# Altium schematic symbol library jlcpcb_2025_04_inductors_extended_0402.schlib: 1396 symbols (part 7 of 8) (continued)
## VHF100505H10NJT
designator L?  Inductance: 10nH
Inductor, 10nH, ±5%, 470mΩ, 250mA, SMD 0402; Manufacturer: FH(Guangdong Fenghua Advanced Tech); Manufacturer Part Number: VHF100505H10NJT; Package Size: 0402; JLCPCB Basic Part: No; JLCPCB Part Number: C90140; Supplier 1: LCSC; Category: Inductors; Supplier Part Number 1: C90140; Tolerance: ±5%; Rated Current: 250mA; DC Resistance: 470mΩ; RoHS: Yes; ComponentLink1Description: Datasheet; ComponentLink1URL: https://wmsc.lcsc.com/wmsc/upload/file/pdf/v2/lcsc/2304140030_FH--Guangdong-Fenghua-Advanced-Tech-VHF100505H10NJT_C90140.pdf; ComponentLink2Description: JLCPCB Part URL; ComponentLink2URL: https://jlcpcb.com/partdetail/C90140; ComponentLink3Description: LCSC Part URL; ComponentLink3URL: https://lcsc.com/product-detail/Inductors-SMD_FH-Guangdong-Fenghua-Advanced-Tech-FH-Guangdong-Fenghua-Advanced-Tech-VHF100505H10NJT_C90140.html
footprint IND-0402 (0402 (1005M) Inductor)
pins: 1, 2

## VHF100505H10NKT
designator L?  Inductance: 10nH
Inductor, 10nH, ±10%, 200mΩ, 300mA, SMD 0402; Manufacturer: FH(Guangdong Fenghua Advanced Tech); Manufacturer Part Number: VHF100505H10NKT; Package Size: 0402; JLCPCB Basic Part: No; JLCPCB Part Number: C381878; Supplier 1: LCSC; Category: Inductors; Supplier Part Number 1: C381878; Tolerance: ±10%; Rated Current: 300mA; DC Resistance: 200mΩ; RoHS: Yes; ComponentLink1Description: Datasheet; ComponentLink1URL: https://wmsc.lcsc.com/wmsc/upload/file/pdf/v2/lcsc/2304140030_FH--Guangdong-Fenghua-Advanced-Tech-VHF100505H10NKT_C381878.pdf; ComponentLink2Description: JLCPCB Part URL; ComponentLink2URL: https://jlcpcb.com/partdetail/C381878; ComponentLink3Description: LCSC Part URL; ComponentLink3URL: https://lcsc.com/product-detail/Inductors-SMD_FH-Guangdong-Fenghua-Advanced-Tech-FH-Guangdong-Fenghua-Advanced-Tech-VHF100505H10NKT_C381878.html
footprint IND-0402 (0402 (1005M) Inductor)
pins: 1, 2

## VHF100505H12NJT
designator L?  Inductance: 12nH
Inductor, 12nH, ±5%, 550mΩ, 250mA, SMD 0402; Manufacturer: FH(Guangdong Fenghua Advanced Tech); Manufacturer Part Number: VHF100505H12NJT; Package Size: 0402; JLCPCB Basic Part: No; JLCPCB Part Number: C90199; Supplier 1: LCSC; Category: Inductors; Supplier Part Number 1: C90199; Tolerance: ±5%; Rated Current: 250mA; DC Resistance: 550mΩ; RoHS: Yes; ComponentLink1Description: Datasheet; ComponentLink1URL: https://wmsc.lcsc.com/wmsc/upload/file/pdf/v2/lcsc/2304140030_FH--Guangdong-Fenghua-Advanced-Tech-VHF100505H12NJT_C90199.pdf; ComponentLink2Description: JLCPCB Part URL; ComponentLink2URL: https://jlcpcb.com/partdetail/C90199; ComponentLink3Description: LCSC Part URL; ComponentLink3URL: https://lcsc.com/product-detail/Inductors-SMD_FH-Guangdong-Fenghua-Advanced-Tech-FH-Guangdong-Fenghua-Advanced-Tech-VHF100505H12NJT_C90199.html
footprint IND-0402 (0402 (1005M) Inductor)
pins: 1, 2

## VHF100505H15NJT
designator L?  Inductance: 15nH
Inductor, 15nH, ±5%, 700mΩ, 250mA, SMD 0402; Manufacturer: FH(Guangdong Fenghua Advanced Tech); Manufacturer Part Number: VHF100505H15NJT; Package Size: 0402; JLCPCB Basic Part: No; JLCPCB Part Number: C90174; Supplier 1: LCSC; Category: Inductors; Supplier Part Number 1: C90174; Tolerance: ±5%; Rated Current: 250mA; DC Resistance: 700mΩ; RoHS: Yes; ComponentLink1Description: Datasheet; ComponentLink1URL: https://wmsc.lcsc.com/wmsc/upload/file/pdf/v2/lcsc/2304140030_FH--Guangdong-Fenghua-Advanced-Tech-VHF100505H15NJT_C90174.pdf; ComponentLink2Description: JLCPCB Part URL; ComponentLink2URL: https://jlcpcb.com/partdetail/C90174; ComponentLink3Description: LCSC Part URL; ComponentLink3URL: https://lcsc.com/product-detail/Inductors-SMD_FH-Guangdong-Fenghua-Advanced-Tech-FH-Guangdong-Fenghua-Advanced-Tech-VHF100505H15NJT_C90174.html
footprint IND-0402 (0402 (1005M) Inductor)
pins: 1, 2

## VHF100505H15NKT
designator L?  Inductance: 15nH
Inductor, 15nH, ±10%, 200mΩ, 300mA, SMD 0402; Manufacturer: FH(Guangdong Fenghua Advanced Tech); Manufacturer Part Number: VHF100505H15NKT; Package Size: 0402; JLCPCB Basic Part: No; JLCPCB Part Number: C381880; Supplier 1: LCSC; Category: Inductors; Supplier Part Number 1: C381880; Tolerance: ±10%; Rated Current: 300mA; DC Resistance: 200mΩ; RoHS: Yes; ComponentLink1Description: Datasheet; ComponentLink1URL: https://wmsc.lcsc.com/wmsc/upload/file/pdf/v2/lcsc/2304140030_FH--Guangdong-Fenghua-Advanced-Tech-VHF100505H15NKT_C381880.pdf; ComponentLink2Description: JLCPCB Part URL; ComponentLink2URL: https://jlcpcb.com/partdetail/C381880; ComponentLink3Description: LCSC Part URL; ComponentLink3URL: https://lcsc.com/product-detail/Inductors-SMD_FH-Guangdong-Fenghua-Advanced-Tech-FH-Guangdong-Fenghua-Advanced-Tech-VHF100505H15NKT_C381880.html
footprint IND-0402 (0402 (1005M) Inductor)
pins: 1, 2

## VHF100505H18NJT
designator L?  Inductance: 18nH
Inductor, 18nH, ±5%, 700mΩ, 200mA, SMD 0402; Manufacturer: FH(Guangdong Fenghua Advanced Tech); Manufacturer Part Number: VHF100505H18NJT; Package Size: 0402; JLCPCB Basic Part: No; JLCPCB Part Number: C90175; Supplier 1: LCSC; Category: Inductors; Supplier Part Number 1: C90175; Tolerance: ±5%; Rated Current: 200mA; DC Resistance: 700mΩ; RoHS: Yes; ComponentLink1Description: Datasheet; ComponentLink1URL: https://wmsc.lcsc.com/wmsc/upload/file/pdf/v2/lcsc/2304140030_FH--Guangdong-Fenghua-Advanced-Tech-VHF100505H18NJT_C90175.pdf; ComponentLink2Description: JLCPCB Part URL; ComponentLink2URL: https://jlcpcb.com/partdetail/C90175; ComponentLink3Description: LCSC Part URL; ComponentLink3URL: https://lcsc.com/product-detail/Inductors-SMD_FH-Guangdong-Fenghua-Advanced-Tech-FH-Guangdong-Fenghua-Advanced-Tech-VHF100505H18NJT_C90175.html
footprint IND-0402 (0402 (1005M) Inductor)
pins: 1, 2

## VHF100505H18NKT
designator L?  Inductance: 18nH
Inductor, 18nH, ±10%, 200mΩ, 300mA, SMD 0402; Manufacturer: FH(Guangdong Fenghua Advanced Tech); Manufacturer Part Number: VHF100505H18NKT; Package Size: 0402; JLCPCB Basic Part: No; JLCPCB Part Number: C381881; Supplier 1: LCSC; Category: Inductors; Supplier Part Number 1: C381881; Tolerance: ±10%; Rated Current: 300mA; DC Resistance: 200mΩ; RoHS: Yes; ComponentLink1Description: Datasheet; ComponentLink1URL: https://wmsc.lcsc.com/wmsc/upload/file/pdf/v2/lcsc/2304140030_FH--Guangdong-Fenghua-Advanced-Tech-VHF100505H18NKT_C381881.pdf; ComponentLink2Description: JLCPCB Part URL; ComponentLink2URL: https://jlcpcb.com/partdetail/C381881; ComponentLink3Description: LCSC Part URL; ComponentLink3URL: https://lcsc.com/product-detail/Inductors-SMD_FH-Guangdong-Fenghua-Advanced-Tech-FH-Guangdong-Fenghua-Advanced-Tech-VHF100505H18NKT_C381881.html
footprint IND-0402 (0402 (1005M) Inductor)
pins: 1, 2

## VHF100505H20NJT
designator L?  Inductance: 20nH
Inductor, 20nH, ±5%, 1.1Ω, 200mA, SMD 0402; Manufacturer: FH(Guangdong Fenghua Advanced Tech); Manufacturer Part Number: VHF100505H20NJT; Package Size: 0402; JLCPCB Basic Part: No; JLCPCB Part Number: C381846; Supplier 1: LCSC; Category: Inductors; Supplier Part Number 1: C381846; Tolerance: ±5%; Rated Current: 200mA; DC Resistance: 1.1Ω; RoHS: Yes; ComponentLink1Description: Datasheet; ComponentLink1URL: https://wmsc.lcsc.com/wmsc/upload/file/pdf/v2/lcsc/2304140030_FH--Guangdong-Fenghua-Advanced-Tech-VHF100505H20NJT_C381846.pdf; ComponentLink2Description: JLCPCB Part URL; ComponentLink2URL: https://jlcpcb.com/partdetail/C381846; ComponentLink3Description: LCSC Part URL; ComponentLink3URL: https://lcsc.com/product-detail/Inductors-SMD_FH-Guangdong-Fenghua-Advanced-Tech-FH-Guangdong-Fenghua-Advanced-Tech-VHF100505H20NJT_C381846.html
footprint IND-0402 (0402 (1005M) Inductor)
pins: 1, 2

## VHF100505H20NKT
designator L?  Inductance: 20nH
Inductor, 20nH, ±10%, 1.1Ω, 200mA, SMD 0402; Manufacturer: FH(Guangdong Fenghua Advanced Tech); Manufacturer Part Number: VHF100505H20NKT; Package Size: 0402; JLCPCB Basic Part: No; JLCPCB Part Number: C381882; Supplier 1: LCSC; Category: Inductors; Supplier Part Number 1: C381882; Tolerance: ±10%; Rated Current: 200mA; DC Resistance: 1.1Ω; RoHS: Yes; ComponentLink1Description: Datasheet; ComponentLink1URL: https://wmsc.lcsc.com/wmsc/upload/file/pdf/v2/lcsc/2304140030_FH--Guangdong-Fenghua-Advanced-Tech-VHF100505H20NKT_C381882.pdf; ComponentLink2Description: JLCPCB Part URL; ComponentLink2URL: https://jlcpcb.com/partdetail/C381882; ComponentLink3Description: LCSC Part URL; ComponentLink3URL: https://lcsc.com/product-detail/Inductors-SMD_FH-Guangdong-Fenghua-Advanced-Tech-FH-Guangdong-Fenghua-Advanced-Tech-VHF100505H20NKT_C381882.html
footprint IND-0402 (0402 (1005M) Inductor)
pins: 1, 2

## VHF100505H22NJT
designator L?  Inductance: 22nH
Inductor, 22nH, ±5%, 900mΩ, 200mA, SMD 0402; Manufacturer: FH(Guangdong Fenghua Advanced Tech); Manufacturer Part Number: VHF100505H22NJT; Package Size: 0402; JLCPCB Basic Part: No; JLCPCB Part Number: C90176; Supplier 1: LCSC; Category: Inductors; Supplier Part Number 1: C90176; Tolerance: ±5%; Rated Current: 200mA; DC Resistance: 900mΩ; RoHS: Yes; ComponentLink1Description: Datasheet; ComponentLink1URL: https://wmsc.lcsc.com/wmsc/upload/file/pdf/v2/lcsc/2304140030_FH--Guangdong-Fenghua-Advanced-Tech-VHF100505H22NJT_C90176.pdf; ComponentLink2Description: JLCPCB Part URL; ComponentLink2URL: https://jlcpcb.com/partdetail/C90176; ComponentLink3Description: LCSC Part URL; ComponentLink3URL: https://lcsc.com/product-detail/Inductors-SMD_FH-Guangdong-Fenghua-Advanced-Tech-FH-Guangdong-Fenghua-Advanced-Tech-VHF100505H22NJT_C90176.html
footprint IND-0402 (0402 (1005M) Inductor)
pins: 1, 2

## VHF100505H22NKT
designator L?  Inductance: 22nH
Inductor, 22nH, ±10%, 200mΩ, 300mA, SMD 0402; Manufacturer: FH(Guangdong Fenghua Advanced Tech); Manufacturer Part Number: VHF100505H22NKT; Package Size: 0402; JLCPCB Basic Part: No; JLCPCB Part Number: C381883; Supplier 1: LCSC; Category: Inductors; Supplier Part Number 1: C381883; Tolerance: ±10%; Rated Current: 300mA; DC Resistance: 200mΩ; RoHS: Yes; ComponentLink1Description: Datasheet; ComponentLink1URL: https://wmsc.lcsc.com/wmsc/upload/file/pdf/v2/lcsc/2304140030_FH--Guangdong-Fenghua-Advanced-Tech-VHF100505H22NKT_C381883.pdf; ComponentLink2Description: JLCPCB Part URL; ComponentLink2URL: https://jlcpcb.com/partdetail/C381883; ComponentLink3Description: LCSC Part URL; ComponentLink3URL: https://lcsc.com/product-detail/Inductors-SMD_FH-Guangdong-Fenghua-Advanced-Tech-FH-Guangdong-Fenghua-Advanced-Tech-VHF100505H22NKT_C381883.html
footprint IND-0402 (0402 (1005M) Inductor)
pins: 1, 2

## VHF100505H24NJT
designator L?  Inductance: 24nH
Inductor, 24nH, ±5%, SMD 0402; Manufacturer: FH(Guangdong Fenghua Advanced Tech); Manufacturer Part Number: VHF100505H24NJT; Package Size: 0402; JLCPCB Basic Part: No; JLCPCB Part Number: C401493; Supplier 1: LCSC; Category: Inductors; Supplier Part Number 1: C401493; Tolerance: ±5%; RoHS: Yes; ComponentLink1Description: Datasheet; ComponentLink1URL: https://wmsc.lcsc.com/wmsc/upload/file/pdf/v2/lcsc/2304140030_FH--Guangdong-Fenghua-Advanced-Tech-VHF100505H24NJT_C401493.pdf; ComponentLink2Description: JLCPCB Part URL; ComponentLink2URL: https://jlcpcb.com/partdetail/C401493; ComponentLink3Description: LCSC Part URL; ComponentLink3URL: https://lcsc.com/product-detail/Inductors-SMD_FH-Guangdong-Fenghua-Advanced-Tech-FH-Guangdong-Fenghua-Advanced-Tech-VHF100505H24NJT_C401493.html
footprint IND-0402 (0402 (1005M) Inductor)
pins: 1, 2

## VHF100505H27NJT
designator L?  Inductance: 27nH
Inductor, 27nH, ±5%, 100mΩ, 200mA, SMD 0402; Manufacturer: FH(Guangdong Fenghua Advanced Tech); Manufacturer Part Number: VHF100505H27NJT; Package Size: 0402; JLCPCB Basic Part: No; JLCPCB Part Number: C90177; Supplier 1: LCSC; Category: Inductors; Supplier Part Number 1: C90177; Tolerance: ±5%; Rated Current: 200mA; DC Resistance: 100mΩ; RoHS: Yes; ComponentLink1Description: Datasheet; ComponentLink1URL: https://wmsc.lcsc.com/wmsc/upload/file/pdf/v2/lcsc/2304140030_FH--Guangdong-Fenghua-Advanced-Tech-VHF100505H27NJT_C90177.pdf; ComponentLink2Description: JLCPCB Part URL; ComponentLink2URL: https://jlcpcb.com/partdetail/C90177; ComponentLink3Description: LCSC Part URL; ComponentLink3URL: https://lcsc.com/product-detail/Inductors-SMD_FH-Guangdong-Fenghua-Advanced-Tech-FH-Guangdong-Fenghua-Advanced-Tech-VHF100505H27NJT_C90177.html
footprint IND-0402 (0402 (1005M) Inductor)
pins: 1, 2

## VHF100505H27NKT
designator L?  Inductance: 27nH
Inductor, 27nH, ±10%, 300mΩ, 300mA, SMD 0402; Manufacturer: FH(Guangdong Fenghua Advanced Tech); Manufacturer Part Number: VHF100505H27NKT; Package Size: 0402; JLCPCB Basic Part: No; JLCPCB Part Number: C381884; Supplier 1: LCSC; Category: Inductors; Supplier Part Number 1: C381884; Tolerance: ±10%; Rated Current: 300mA; DC Resistance: 300mΩ; RoHS: Yes; ComponentLink1Description: Datasheet; ComponentLink1URL: https://wmsc.lcsc.com/wmsc/upload/file/pdf/v2/lcsc/2304140030_FH--Guangdong-Fenghua-Advanced-Tech-VHF100505H27NKT_C381884.pdf; ComponentLink2Description: JLCPCB Part URL; ComponentLink2URL: https://jlcpcb.com/partdetail/C381884; ComponentLink3Description: LCSC Part URL; ComponentLink3URL: https://lcsc.com/product-detail/Inductors-SMD_FH-Guangdong-Fenghua-Advanced-Tech-FH-Guangdong-Fenghua-Advanced-Tech-VHF100505H27NKT_C381884.html
footprint IND-0402 (0402 (1005M) Inductor)
pins: 1, 2

## VHF100505H33NJT
designator L?  Inductance: 33nH
Inductor, 33nH, ±5%, 1.1Ω, 200mA, SMD 0402; Manufacturer: FH(Guangdong Fenghua Advanced Tech); Manufacturer Part Number: VHF100505H33NJT; Package Size: 0402; JLCPCB Basic Part: No; JLCPCB Part Number: C401492; Supplier 1: LCSC; Category: Inductors; Supplier Part Number 1: C401492; Tolerance: ±5%; Rated Current: 200mA; DC Resistance: 1.1Ω; RoHS: Yes; ComponentLink1Description: Datasheet; ComponentLink1URL: https://wmsc.lcsc.com/wmsc/upload/file/pdf/v2/lcsc/2304140030_FH--Guangdong-Fenghua-Advanced-Tech-VHF100505H33NJT_C401492.pdf; ComponentLink2Description: JLCPCB Part URL; ComponentLink2URL: https://jlcpcb.com/partdetail/C401492; ComponentLink3Description: LCSC Part URL; ComponentLink3URL: https://lcsc.com/product-detail/Inductors-SMD_FH-Guangdong-Fenghua-Advanced-Tech-FH-Guangdong-Fenghua-Advanced-Tech-VHF100505H33NJT_C401492.html
footprint IND-0402 (0402 (1005M) Inductor)
pins: 1, 2

## VHF100505H33NKT
designator L?  Inductance: 33nH
Inductor, 33nH, ±10%, 300mΩ, 300mA, SMD 0402; Manufacturer: FH(Guangdong Fenghua Advanced Tech); Manufacturer Part Number: VHF100505H33NKT; Package Size: 0402; JLCPCB Basic Part: No; JLCPCB Part Number: C381885; Supplier 1: LCSC; Category: Inductors; Supplier Part Number 1: C381885; Tolerance: ±10%; Rated Current: 300mA; DC Resistance: 300mΩ; RoHS: Yes; ComponentLink1Description: Datasheet; ComponentLink1URL: https://wmsc.lcsc.com/wmsc/upload/file/pdf/v2/lcsc/2304140030_FH--Guangdong-Fenghua-Advanced-Tech-VHF100505H33NKT_C381885.pdf; ComponentLink2Description: JLCPCB Part URL; ComponentLink2URL: https://jlcpcb.com/partdetail/C381885; ComponentLink3Description: LCSC Part URL; ComponentLink3URL: https://lcsc.com/product-detail/Inductors-SMD_FH-Guangdong-Fenghua-Advanced-Tech-FH-Guangdong-Fenghua-Advanced-Tech-VHF100505H33NKT_C381885.html
footprint IND-0402 (0402 (1005M) Inductor)
pins: 1, 2

## VHF100505H39NJT
designator L?  Inductance: 39nH
Inductor, 39nH, ±5%, 1.3Ω, 150mA, SMD 0402; Manufacturer: FH(Guangdong Fenghua Advanced Tech); Manufacturer Part Number: VHF100505H39NJT; Package Size: 0402; JLCPCB Basic Part: No; JLCPCB Part Number: C90179; Supplier 1: LCSC; Category: Inductors; Supplier Part Number 1: C90179; Tolerance: ±5%; Rated Current: 150mA; DC Resistance: 1.3Ω; RoHS: Yes; ComponentLink1Description: Datasheet; ComponentLink1URL: https://wmsc.lcsc.com/wmsc/upload/file/pdf/v2/lcsc/2304140030_FH--Guangdong-Fenghua-Advanced-Tech-VHF100505H39NJT_C90179.pdf; ComponentLink2Description: JLCPCB Part URL; ComponentLink2URL: https://jlcpcb.com/partdetail/C90179; ComponentLink3Description: LCSC Part URL; ComponentLink3URL: https://lcsc.com/product-detail/Inductors-SMD_FH-Guangdong-Fenghua-Advanced-Tech-FH-Guangdong-Fenghua-Advanced-Tech-VHF100505H39NJT_C90179.html
footprint IND-0402 (0402 (1005M) Inductor)
pins: 1, 2

## VHF100505H39NKT
designator L?  Inductance: 39nH
Inductor, 39nH, ±10%, 300mΩ, 300mA, SMD 0402; Manufacturer: FH(Guangdong Fenghua Advanced Tech); Manufacturer Part Number: VHF100505H39NKT; Package Size: 0402; JLCPCB Basic Part: No; JLCPCB Part Number: C381886; Supplier 1: LCSC; Category: Inductors; Supplier Part Number 1: C381886; Tolerance: ±10%; Rated Current: 300mA; DC Resistance: 300mΩ; RoHS: Yes; ComponentLink1Description: Datasheet; ComponentLink1URL: https://wmsc.lcsc.com/wmsc/upload/file/pdf/v2/lcsc/2304140030_FH--Guangdong-Fenghua-Advanced-Tech-VHF100505H39NKT_C381886.pdf; ComponentLink2Description: JLCPCB Part URL; ComponentLink2URL: https://jlcpcb.com/partdetail/C381886; ComponentLink3Description: LCSC Part URL; ComponentLink3URL: https://lcsc.com/product-detail/Inductors-SMD_FH-Guangdong-Fenghua-Advanced-Tech-FH-Guangdong-Fenghua-Advanced-Tech-VHF100505H39NKT_C381886.html
footprint IND-0402 (0402 (1005M) Inductor)
pins: 1, 2

## VHF100505H43NJT
designator L?  Inductance: 43nH
Inductor, 43nH, ±5%, 1.1Ω, 200mA, SMD 0402; Manufacturer: FH(Guangdong Fenghua Advanced Tech); Manufacturer Part Number: VHF100505H43NJT; Package Size: 0402; JLCPCB Basic Part: No; JLCPCB Part Number: C381847; Supplier 1: LCSC; Category: Inductors; Supplier Part Number 1: C381847; Tolerance: ±5%; Rated Current: 200mA; DC Resistance: 1.1Ω; RoHS: Yes; ComponentLink1Description: Datasheet; ComponentLink1URL: https://wmsc.lcsc.com/wmsc/upload/file/pdf/v2/lcsc/2304140030_FH--Guangdong-Fenghua-Advanced-Tech-VHF100505H43NJT_C381847.pdf; ComponentLink2Description: JLCPCB Part URL; ComponentLink2URL: https://jlcpcb.com/partdetail/C381847; ComponentLink3Description: LCSC Part URL; ComponentLink3URL: https://lcsc.com/product-detail/Inductors-SMD_FH-Guangdong-Fenghua-Advanced-Tech-FH-Guangdong-Fenghua-Advanced-Tech-VHF100505H43NJT_C381847.html
footprint IND-0402 (0402 (1005M) Inductor)
pins: 1, 2

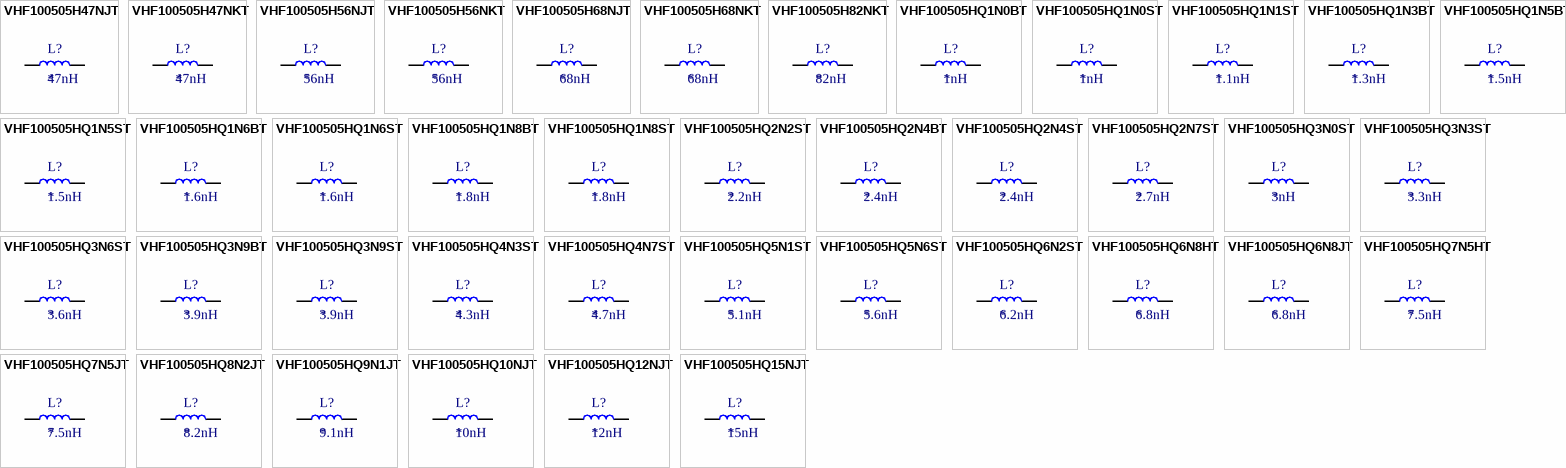
[diagram p33: symbols VHF100505H47NJT to VHF100505HQ15NJT]

## VHF100505H47NJT
designator L?  Inductance: 47nH
Inductor, 47nH, ±5%, 1.1Ω, 150mA, SMD 0402; Manufacturer: FH(Guangdong Fenghua Advanced Tech); Manufacturer Part Number: VHF100505H47NJT; Package Size: 0402; JLCPCB Basic Part: No; JLCPCB Part Number: C90180; Supplier 1: LCSC; Category: Inductors; Supplier Part Number 1: C90180; Tolerance: ±5%; Rated Current: 150mA; DC Resistance: 1.1Ω; RoHS: Yes; ComponentLink1Description: Datasheet; ComponentLink1URL: https://wmsc.lcsc.com/wmsc/upload/file/pdf/v2/lcsc/2304140030_FH--Guangdong-Fenghua-Advanced-Tech-VHF100505H47NJT_C90180.pdf; ComponentLink2Description: JLCPCB Part URL; ComponentLink2URL: https://jlcpcb.com/partdetail/C90180; ComponentLink3Description: LCSC Part URL; ComponentLink3URL: https://lcsc.com/product-detail/Inductors-SMD_FH-Guangdong-Fenghua-Advanced-Tech-FH-Guangdong-Fenghua-Advanced-Tech-VHF100505H47NJT_C90180.html
footprint IND-0402 (0402 (1005M) Inductor)
pins: 1, 2

## VHF100505H47NKT
designator L?  Inductance: 47nH
Inductor, 47nH, ±10%, 300mΩ, 300mA, SMD 0402; Manufacturer: FH(Guangdong Fenghua Advanced Tech); Manufacturer Part Number: VHF100505H47NKT; Package Size: 0402; JLCPCB Basic Part: No; JLCPCB Part Number: C381888; Supplier 1: LCSC; Category: Inductors; Supplier Part Number 1: C381888; Tolerance: ±10%; Rated Current: 300mA; DC Resistance: 300mΩ; RoHS: Yes; ComponentLink1Description: Datasheet; ComponentLink1URL: https://wmsc.lcsc.com/wmsc/upload/file/pdf/v2/lcsc/2304140030_FH--Guangdong-Fenghua-Advanced-Tech-VHF100505H47NKT_C381888.pdf; ComponentLink2Description: JLCPCB Part URL; ComponentLink2URL: https://jlcpcb.com/partdetail/C381888; ComponentLink3Description: LCSC Part URL; ComponentLink3URL: https://lcsc.com/product-detail/Inductors-SMD_FH-Guangdong-Fenghua-Advanced-Tech-FH-Guangdong-Fenghua-Advanced-Tech-VHF100505H47NKT_C381888.html
footprint IND-0402 (0402 (1005M) Inductor)
pins: 1, 2

## VHF100505H56NJT
designator L?  Inductance: 56nH
Inductor, 56nH, ±5%, 1.2Ω, 200mA, SMD 0402; Manufacturer: FH(Guangdong Fenghua Advanced Tech); Manufacturer Part Number: VHF100505H56NJT; Package Size: 0402; JLCPCB Basic Part: No; JLCPCB Part Number: C90181; Supplier 1: LCSC; Category: Inductors; Supplier Part Number 1: C90181; Tolerance: ±5%; Rated Current: 200mA; DC Resistance: 1.2Ω; RoHS: Yes; ComponentLink1Description: Datasheet; ComponentLink1URL: https://wmsc.lcsc.com/wmsc/upload/file/pdf/v2/lcsc/1811141733_FH--Guangdong-Fenghua-Advanced-Tech-VHF100505H56NJT_C90181.pdf; ComponentLink2Description: JLCPCB Part URL; ComponentLink2URL: https://jlcpcb.com/partdetail/C90181; ComponentLink3Description: LCSC Part URL; ComponentLink3URL: https://lcsc.com/product-detail/Inductors-SMD_FH-Guangdong-Fenghua-Advanced-Tech-FH-Guangdong-Fenghua-Advanced-Tech-VHF100505H56NJT_C90181.html
footprint IND-0402 (0402 (1005M) Inductor)
pins: 1, 2

## VHF100505H56NKT
designator L?  Inductance: 56nH
Inductor, 56nH, ±10%, 1.2Ω, 200mA, SMD 0402; Manufacturer: FH(Guangdong Fenghua Advanced Tech); Manufacturer Part Number: VHF100505H56NKT; Package Size: 0402; JLCPCB Basic Part: No; JLCPCB Part Number: C381889; Supplier 1: LCSC; Category: Inductors; Supplier Part Number 1: C381889; Tolerance: ±10%; Rated Current: 200mA; DC Resistance: 1.2Ω; RoHS: Yes; ComponentLink1Description: Datasheet; ComponentLink1URL: https://wmsc.lcsc.com/wmsc/upload/file/pdf/v2/lcsc/2304140030_FH--Guangdong-Fenghua-Advanced-Tech-VHF100505H56NKT_C381889.pdf; ComponentLink2Description: JLCPCB Part URL; ComponentLink2URL: https://jlcpcb.com/partdetail/C381889; ComponentLink3Description: LCSC Part URL; ComponentLink3URL: https://lcsc.com/product-detail/Inductors-SMD_FH-Guangdong-Fenghua-Advanced-Tech-FH-Guangdong-Fenghua-Advanced-Tech-VHF100505H56NKT_C381889.html
footprint IND-0402 (0402 (1005M) Inductor)
pins: 1, 2

## VHF100505H68NJT
designator L?  Inductance: 68nH
Inductor, 68nH, ±5%, SMD 0402; Manufacturer: FH(Guangdong Fenghua Advanced Tech); Manufacturer Part Number: VHF100505H68NJT; Package Size: 0402; JLCPCB Basic Part: No; JLCPCB Part Number: C90182; Supplier 1: LCSC; Category: Inductors; Supplier Part Number 1: C90182; Tolerance: ±5%; RoHS: Yes; ComponentLink1Description: Datasheet; ComponentLink1URL: https://wmsc.lcsc.com/wmsc/upload/file/pdf/v2/lcsc/2304140030_FH--Guangdong-Fenghua-Advanced-Tech-VHF100505H68NJT_C90182.pdf; ComponentLink2Description: JLCPCB Part URL; ComponentLink2URL: https://jlcpcb.com/partdetail/C90182; ComponentLink3Description: LCSC Part URL; ComponentLink3URL: https://lcsc.com/product-detail/Inductors-SMD_FH-Guangdong-Fenghua-Advanced-Tech-FH-Guangdong-Fenghua-Advanced-Tech-VHF100505H68NJT_C90182.html
footprint IND-0402 (0402 (1005M) Inductor)
pins: 1, 2

## VHF100505H68NKT
designator L?  Inductance: 68nH
Inductor, 68nH, ±10%, 1.4Ω, 180mA, SMD 0402; Manufacturer: FH(Guangdong Fenghua Advanced Tech); Manufacturer Part Number: VHF100505H68NKT; Package Size: 0402; JLCPCB Basic Part: No; JLCPCB Part Number: C381890; Supplier 1: LCSC; Category: Inductors; Supplier Part Number 1: C381890; Tolerance: ±10%; Rated Current: 180mA; DC Resistance: 1.4Ω; RoHS: Yes; ComponentLink1Description: Datasheet; ComponentLink1URL: https://wmsc.lcsc.com/wmsc/upload/file/pdf/v2/lcsc/2304140030_FH--Guangdong-Fenghua-Advanced-Tech-VHF100505H68NKT_C381890.pdf; ComponentLink2Description: JLCPCB Part URL; ComponentLink2URL: https://jlcpcb.com/partdetail/C381890; ComponentLink3Description: LCSC Part URL; ComponentLink3URL: https://lcsc.com/product-detail/Inductors-SMD_FH-Guangdong-Fenghua-Advanced-Tech-FH-Guangdong-Fenghua-Advanced-Tech-VHF100505H68NKT_C381890.html
footprint IND-0402 (0402 (1005M) Inductor)
pins: 1, 2

## VHF100505H82NKT
designator L?  Inductance: 82nH
Inductor, 82nH, ±10%, 2.4Ω, 150mA, SMD 0402; Manufacturer: FH(Guangdong Fenghua Advanced Tech); Manufacturer Part Number: VHF100505H82NKT; Package Size: 0402; JLCPCB Basic Part: No; JLCPCB Part Number: C381891; Supplier 1: LCSC; Category: Inductors; Supplier Part Number 1: C381891; Tolerance: ±10%; Rated Current: 150mA; DC Resistance: 2.4Ω; RoHS: Yes; ComponentLink1Description: Datasheet; ComponentLink1URL: https://wmsc.lcsc.com/wmsc/upload/file/pdf/v2/lcsc/2304140030_FH--Guangdong-Fenghua-Advanced-Tech-VHF100505H82NKT_C381891.pdf; ComponentLink2Description: JLCPCB Part URL; ComponentLink2URL: https://jlcpcb.com/partdetail/C381891; ComponentLink3Description: LCSC Part URL; ComponentLink3URL: https://lcsc.com/product-detail/Inductors-SMD_FH-Guangdong-Fenghua-Advanced-Tech-FH-Guangdong-Fenghua-Advanced-Tech-VHF100505H82NKT_C381891.html
footprint IND-0402 (0402 (1005M) Inductor)
pins: 1, 2

## VHF100505HQ1N0BT
designator L?  Inductance: 1nH
Inductor, 1nH, SMD 0402; Manufacturer: FH (Guangdong Fenghua Advanced Tech); Manufacturer Part Number: VHF100505HQ1N0BT; Package Size: 0402; JLCPCB Basic Part: No; JLCPCB Part Number: C3032801; Supplier 1: LCSC; Category: Inductors; Supplier Part Number 1: C3032801; RoHS: Yes; ComponentLink1Description: Datasheet; ComponentLink1URL: https://wmsc.lcsc.com/wmsc/upload/file/pdf/v2/lcsc/2302231130_FH--Guangdong-Fenghua-Advanced-Tech-VHF100505HQ1N0BT_C3032801.pdf; ComponentLink2Description: JLCPCB Part URL; ComponentLink2URL: https://jlcpcb.com/partdetail/C3032801; ComponentLink3Description: LCSC Part URL; ComponentLink3URL: https://lcsc.com/product-detail/Inductors-SMD_FH-Guangdong-Fenghua-Advanced-Tech-FH-Guangdong-Fenghua-Advanced-Tech-VHF100505HQ1N0BT_C3032801.html
footprint IND-0402 (0402 (1005M) Inductor)
pins: 1, 2

## VHF100505HQ1N0ST
designator L?  Inductance: 1nH
Inductor, 1nH, 100mΩ, 400mA, SMD 0402; Manufacturer: FH(Guangdong Fenghua Advanced Tech); Manufacturer Part Number: VHF100505HQ1N0ST; Package Size: 0402; JLCPCB Basic Part: No; JLCPCB Part Number: C395051; Supplier 1: LCSC; Category: Inductors; Supplier Part Number 1: C395051; Rated Current: 400mA; DC Resistance: 100mΩ; RoHS: Yes; ComponentLink1Description: Datasheet; ComponentLink1URL: https://wmsc.lcsc.com/wmsc/upload/file/pdf/v2/lcsc/2302231208_FH--Guangdong-Fenghua-Advanced-Tech-VHF100505HQ1N0ST_C395051.pdf; ComponentLink2Description: JLCPCB Part URL; ComponentLink2URL: https://jlcpcb.com/partdetail/C395051; ComponentLink3Description: LCSC Part URL; ComponentLink3URL: https://lcsc.com/product-detail/Inductors-SMD_FH-Guangdong-Fenghua-Advanced-Tech-FH-Guangdong-Fenghua-Advanced-Tech-VHF100505HQ1N0ST_C395051.html
footprint IND-0402 (0402 (1005M) Inductor)
pins: 1, 2

## VHF100505HQ1N1ST
designator L?  Inductance: 1.1nH
Inductor, 1.1nH, 100mΩ, 400mA, SMD 0402; Manufacturer: FH(Guangdong Fenghua Advanced Tech); Manufacturer Part Number: VHF100505HQ1N1ST; Package Size: 0402; JLCPCB Basic Part: No; JLCPCB Part Number: C395052; Supplier 1: LCSC; Category: Inductors; Supplier Part Number 1: C395052; Rated Current: 400mA; DC Resistance: 100mΩ; RoHS: Yes; ComponentLink1Description: Datasheet; ComponentLink1URL: https://wmsc.lcsc.com/wmsc/upload/file/pdf/v2/lcsc/2302231208_FH--Guangdong-Fenghua-Advanced-Tech-VHF100505HQ1N1ST_C395052.pdf; ComponentLink2Description: JLCPCB Part URL; ComponentLink2URL: https://jlcpcb.com/partdetail/C395052; ComponentLink3Description: LCSC Part URL; ComponentLink3URL: https://lcsc.com/product-detail/Inductors-SMD_FH-Guangdong-Fenghua-Advanced-Tech-FH-Guangdong-Fenghua-Advanced-Tech-VHF100505HQ1N1ST_C395052.html
footprint IND-0402 (0402 (1005M) Inductor)
pins: 1, 2

## VHF100505HQ1N3BT
designator L?  Inductance: 1.3nH
Inductor, 1.3nH, SMD 0402; Manufacturer: FH (Guangdong Fenghua Advanced Tech); Manufacturer Part Number: VHF100505HQ1N3BT; Package Size: 0402; JLCPCB Basic Part: No; JLCPCB Part Number: C3032796; Supplier 1: LCSC; Category: Inductors; Supplier Part Number 1: C3032796; RoHS: Yes; ComponentLink1Description: Datasheet; ComponentLink1URL: https://wmsc.lcsc.com/wmsc/upload/file/pdf/v2/lcsc/2302231130_FH--Guangdong-Fenghua-Advanced-Tech-VHF100505HQ1N3BT_C3032796.pdf; ComponentLink2Description: JLCPCB Part URL; ComponentLink2URL: https://jlcpcb.com/partdetail/C3032796; ComponentLink3Description: LCSC Part URL; ComponentLink3URL: https://lcsc.com/product-detail/Inductors-SMD_FH-Guangdong-Fenghua-Advanced-Tech-FH-Guangdong-Fenghua-Advanced-Tech-VHF100505HQ1N3BT_C3032796.html
footprint IND-0402 (0402 (1005M) Inductor)
pins: 1, 2

## VHF100505HQ1N5BT
designator L?  Inductance: 1.5nH
Inductor, 1.5nH, SMD 0402; Manufacturer: FH (Guangdong Fenghua Advanced Tech); Manufacturer Part Number: VHF100505HQ1N5BT; Package Size: 0402; JLCPCB Basic Part: No; JLCPCB Part Number: C3032792; Supplier 1: LCSC; Category: Inductors; Supplier Part Number 1: C3032792; RoHS: Yes; ComponentLink1Description: Datasheet; ComponentLink1URL: https://wmsc.lcsc.com/wmsc/upload/file/pdf/v2/lcsc/2302231130_FH--Guangdong-Fenghua-Advanced-Tech-VHF100505HQ1N5BT_C3032792.pdf; ComponentLink2Description: JLCPCB Part URL; ComponentLink2URL: https://jlcpcb.com/partdetail/C3032792; ComponentLink3Description: LCSC Part URL; ComponentLink3URL: https://lcsc.com/product-detail/Inductors-SMD_FH-Guangdong-Fenghua-Advanced-Tech-FH-Guangdong-Fenghua-Advanced-Tech-VHF100505HQ1N5BT_C3032792.html
footprint IND-0402 (0402 (1005M) Inductor)
pins: 1, 2

## VHF100505HQ1N5ST
designator L?  Inductance: 1.5nH
Inductor, 1.5nH, 100mΩ, 300mA, SMD 0402; Manufacturer: FH(Guangdong Fenghua Advanced Tech); Manufacturer Part Number: VHF100505HQ1N5ST; Package Size: 0402; JLCPCB Basic Part: No; JLCPCB Part Number: C395055; Supplier 1: LCSC; Category: Inductors; Supplier Part Number 1: C395055; Rated Current: 300mA; DC Resistance: 100mΩ; RoHS: Yes; ComponentLink1Description: Datasheet; ComponentLink1URL: https://wmsc.lcsc.com/wmsc/upload/file/pdf/v2/lcsc/2302231208_FH--Guangdong-Fenghua-Advanced-Tech-VHF100505HQ1N5ST_C395055.pdf; ComponentLink2Description: JLCPCB Part URL; ComponentLink2URL: https://jlcpcb.com/partdetail/C395055; ComponentLink3Description: LCSC Part URL; ComponentLink3URL: https://lcsc.com/product-detail/Inductors-SMD_FH-Guangdong-Fenghua-Advanced-Tech-FH-Guangdong-Fenghua-Advanced-Tech-VHF100505HQ1N5ST_C395055.html
footprint IND-0402 (0402 (1005M) Inductor)
pins: 1, 2

## VHF100505HQ1N6BT
designator L?  Inductance: 1.6nH
Inductor, 1.6nH, SMD 0402; Manufacturer: FH (Guangdong Fenghua Advanced Tech); Manufacturer Part Number: VHF100505HQ1N6BT; Package Size: 0402; JLCPCB Basic Part: No; JLCPCB Part Number: C3032799; Supplier 1: LCSC; Category: Inductors; Supplier Part Number 1: C3032799; RoHS: Yes; ComponentLink1Description: Datasheet; ComponentLink1URL: https://wmsc.lcsc.com/wmsc/upload/file/pdf/v2/lcsc/2302231130_FH--Guangdong-Fenghua-Advanced-Tech-VHF100505HQ1N6BT_C3032799.pdf; ComponentLink2Description: JLCPCB Part URL; ComponentLink2URL: https://jlcpcb.com/partdetail/C3032799; ComponentLink3Description: LCSC Part URL; ComponentLink3URL: https://lcsc.com/product-detail/Inductors-SMD_FH-Guangdong-Fenghua-Advanced-Tech-FH-Guangdong-Fenghua-Advanced-Tech-VHF100505HQ1N6BT_C3032799.html
footprint IND-0402 (0402 (1005M) Inductor)
pins: 1, 2

## VHF100505HQ1N6ST
designator L?  Inductance: 1.6nH
Inductor, 1.6nH, 100mΩ, 300mA, SMD 0402; Manufacturer: FH(Guangdong Fenghua Advanced Tech); Manufacturer Part Number: VHF100505HQ1N6ST; Package Size: 0402; JLCPCB Basic Part: No; JLCPCB Part Number: C395056; Supplier 1: LCSC; Category: Inductors; Supplier Part Number 1: C395056; Rated Current: 300mA; DC Resistance: 100mΩ; RoHS: Yes; ComponentLink1Description: Datasheet; ComponentLink1URL: https://wmsc.lcsc.com/wmsc/upload/file/pdf/v2/lcsc/2302231208_FH--Guangdong-Fenghua-Advanced-Tech-VHF100505HQ1N6ST_C395056.pdf; ComponentLink2Description: JLCPCB Part URL; ComponentLink2URL: https://jlcpcb.com/partdetail/C395056; ComponentLink3Description: LCSC Part URL; ComponentLink3URL: https://lcsc.com/product-detail/Inductors-SMD_FH-Guangdong-Fenghua-Advanced-Tech-FH-Guangdong-Fenghua-Advanced-Tech-VHF100505HQ1N6ST_C395056.html
footprint IND-0402 (0402 (1005M) Inductor)
pins: 1, 2
